# Altium footprint library ConnectorsTDH.PcbLib: 194 footprints (part 7 of 13)
Each footprint in its own frame and in the unit in brackets; x right, y up, seen from the top. Pads: shape width x height; smd on the part's side, far side on the other; paste and mask are expansions set on the pad; w line width, h text height; cw(c..) or ccw(c..) is an arc to the next point about the centre after c.
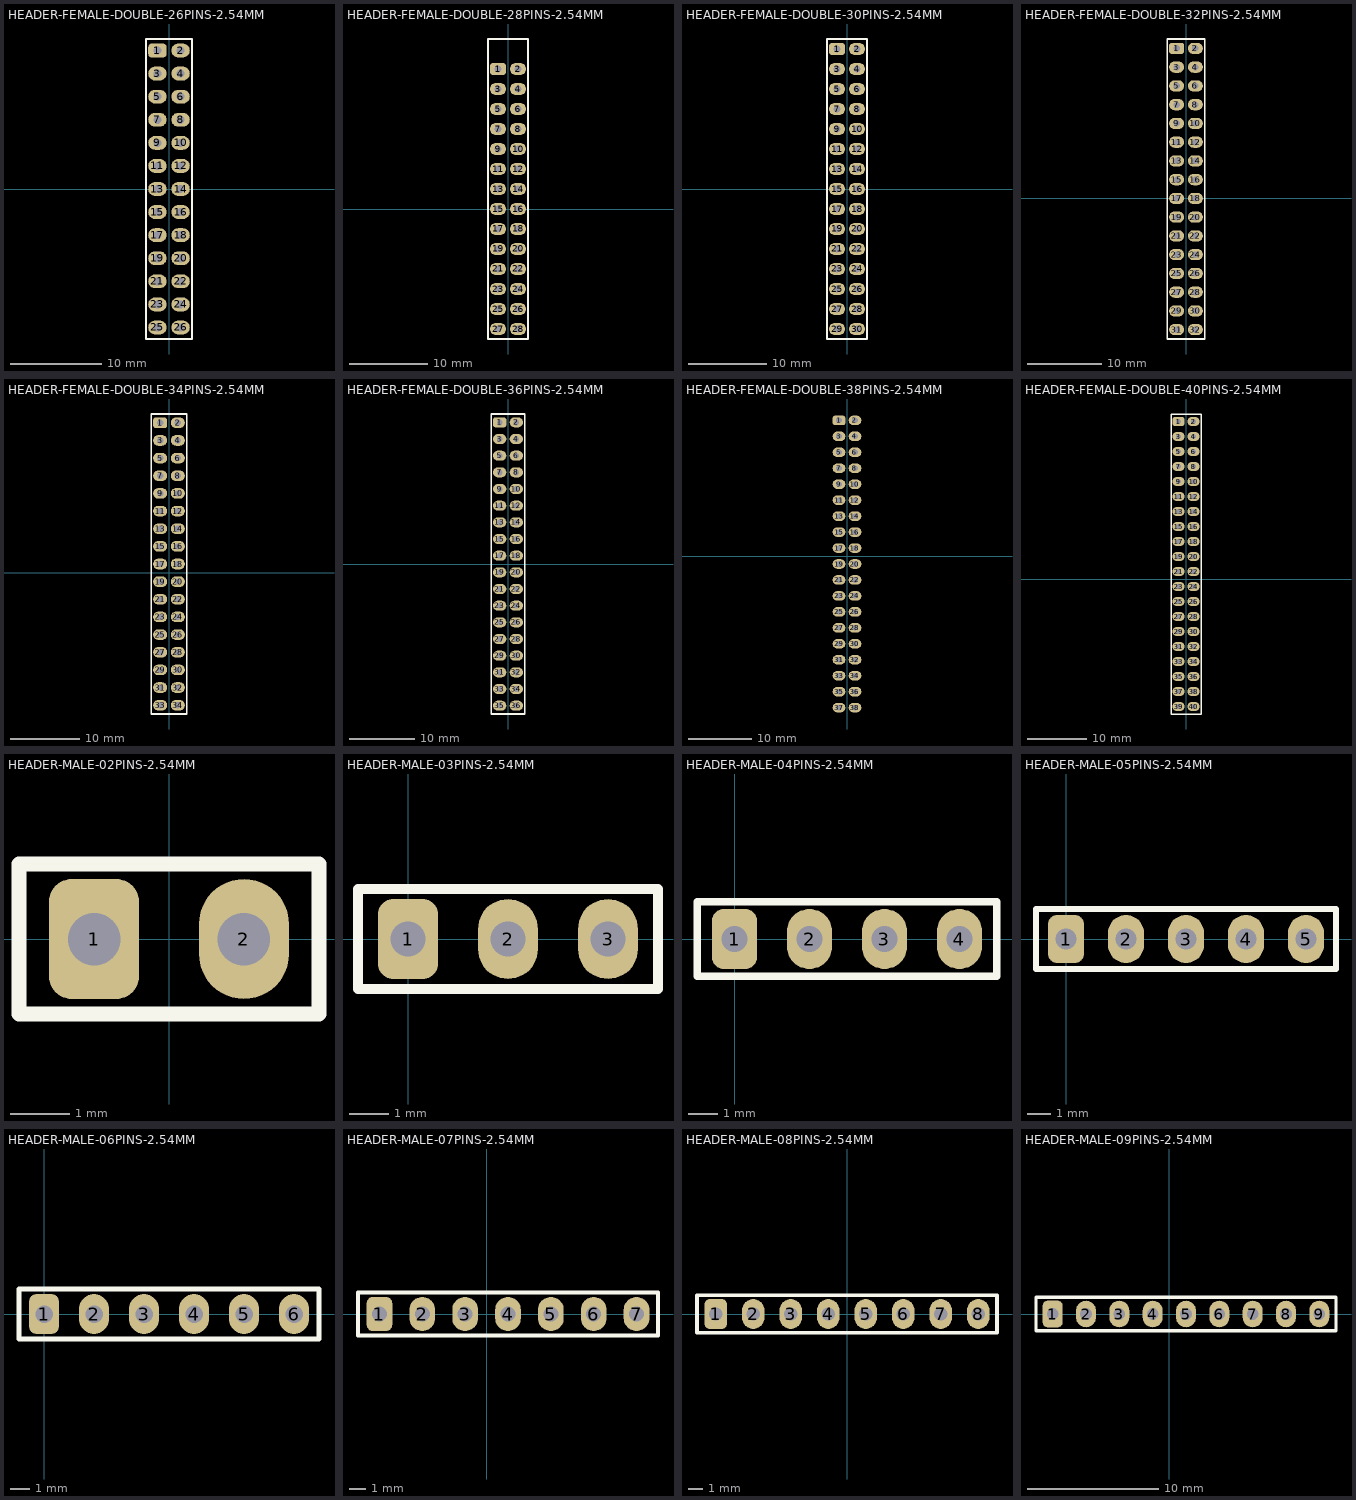
[diagram p6: the footprints below, top view; thin cyan lines are the x and y axes]

## HEADER-FEMALE-DOUBLE-26PINS-2.54MM [mil]
pads (26):
  rrect50% 80x60 hole 35: 1(-50,600)
  oval 80x60 hole 35: 2(50,600) 3(-50,500) 4(50,500) 5(-50,400) 6(50,400) 7(-50,300) 8(50,300) 9(-50,200) 10(50,200) 11(-50,100) 12(50,100) 13(-50,0) 14(50,0) 15(-50,-100) 16(50,-100) 17(-50,-200) 18(50,-200) 19(-50,-300) 20(50,-300) 21(-50,-400) 22(50,-400) 23(-50,-500) 24(50,-500) 25(-50,-600) 26(50,-600)
Top Overlay:
  lines w10: -100,-650 -100,650 100,650 100,-650 -100,-650
3D body "26-Pin Header - Female - Double - 2.54mm.step": height 334.65, standoff -118.11, extent -97.64,-659.84 99.21,659.85

## HEADER-FEMALE-DOUBLE-28PINS-2.54MM [mil]
pads (28):
  rrect50% 80x60 hole 35: 1(-50,700)
  oval 80x60 hole 35: 2(50,700) 3(-50,600) 4(50,600) 5(-50,500) 6(50,500) 7(-50,400) 8(50,400) 9(-50,300) 10(50,300) 11(-50,200) 12(50,200) 13(-50,100) 14(50,100) 15(-50,0) 16(50,0) 17(-50,-100) 18(50,-100) 19(-50,-200) 20(50,-200) 21(-50,-300) 22(50,-300) 23(-50,-400) 24(50,-400) 25(-50,-500) 26(50,-500) 27(-50,-600) 28(50,-600)
Top Overlay:
  lines w10: -100,-650 -100,850 100,850 100,-650 -100,-650
3D body "28-Pin Header - Female - Double - 2.54mm.step": height 334.65, standoff -118.11, extent -97.64,-659.84 99.21,859.85

## HEADER-FEMALE-DOUBLE-30PINS-2.54MM [mil]
pads (30):
  rrect50% 80x60 hole 35: 1(-50,700)
  oval 80x60 hole 35: 2(50,700) 3(-50,600) 4(50,600) 5(-50,500) 6(50,500) 7(-50,400) 8(50,400) 9(-50,300) 10(50,300) 11(-50,200) 12(50,200) 13(-50,100) 14(50,100) 15(-50,0) 16(50,0) 17(-50,-100) 18(50,-100) 19(-50,-200) 20(50,-200) 21(-50,-300) 22(50,-300) 23(-50,-400) 24(50,-400) 25(-50,-500) 26(50,-500) 27(-50,-600) 28(50,-600) 29(-50,-700) 30(50,-700)
Top Overlay:
  lines w10: -100,-750 -100,750 100,750 100,-750 -100,-750
3D body "28-Pin Header - Female - Double - 2.54mm.step": height 334.65, standoff -118.11, extent -97.64,-759.84 99.21,759.85

## HEADER-FEMALE-DOUBLE-32PINS-2.54MM [mil]
pads (32):
  rrect50% 80x60 hole 35: 1(-50,800)
  oval 80x60 hole 35: 2(50,800) 3(-50,700) 4(50,700) 5(-50,600) 6(50,600) 7(-50,500) 8(50,500) 9(-50,400) 10(50,400) 11(-50,300) 12(50,300) 13(-50,200) 14(50,200) 15(-50,100) 16(50,100) 17(-50,0) 18(50,0) 19(-50,-100) 20(50,-100) 21(-50,-200) 22(50,-200) 23(-50,-300) 24(50,-300) 25(-50,-400) 26(50,-400) 27(-50,-500) 28(50,-500) 29(-50,-600) 30(50,-600) 31(-50,-700) 32(50,-700)
Top Overlay:
  lines w10: -100,-750 -100,850 100,850 100,-750 -100,-750
3D body "32-Pin Header - Female - Double - 2.54mm.step": height 334.65, standoff -118.11, extent -97.64,-759.84 99.21,859.85

## HEADER-FEMALE-DOUBLE-34PINS-2.54MM [mil]
pads (34):
  rrect50% 80x60 hole 35: 1(-50,850)
  oval 80x60 hole 35: 2(50,850) 3(-50,750) 4(50,750) 5(-50,650) 6(50,650) 7(-50,550) 8(50,550) 9(-50,450) 10(50,450) 11(-50,350) 12(50,350) 13(-50,250) 14(50,250) 15(-50,150) 16(50,150) 17(-50,50) 18(50,50) 19(-50,-50) 20(50,-50) 21(-50,-150) 22(50,-150) 23(-50,-250) 24(50,-250) 25(-50,-350) 26(50,-350) 27(-50,-450) 28(50,-450) 29(-50,-550) 30(50,-550) 31(-50,-650) 32(50,-650) 33(-50,-750) 34(50,-750)
Top Overlay:
  lines w10: -100,-800 100,-800 100,900 -100,900 -100,-800
3D body "34-Pin Header - Female - Double - 2.54mm.step": height 334.65, standoff -118.11, extent -97.64,-809.84 99.21,909.85

## HEADER-FEMALE-DOUBLE-36PINS-2.54MM [mil]
pads (36):
  rrect50% 80x60 hole 35: 1(-50,850)
  oval 80x60 hole 35: 2(50,850) 3(-50,750) 4(50,750) 5(-50,650) 6(50,650) 7(-50,550) 8(50,550) 9(-50,450) 10(50,450) 11(-50,350) 12(50,350) 13(-50,250) 14(50,250) 15(-50,150) 16(50,150) 17(-50,50) 18(50,50) 19(-50,-50) 20(50,-50) 21(-50,-150) 22(50,-150) 23(-50,-250) 24(50,-250) 25(-50,-350) 26(50,-350) 27(-50,-450) 28(50,-450) 29(-50,-550) 30(50,-550) 31(-50,-650) 32(50,-650) 33(-50,-750) 34(50,-750) 35(-50,-850) 36(50,-850)
Top Overlay:
  lines w10: -100,-900 -100,900 100,900 100,-900 -100,-900
3D body "36-Pin Header - Female - Double - 2.54mm.step": height 334.65, standoff -118.11, extent -97.64,-909.84 99.21,909.85

## HEADER-FEMALE-DOUBLE-38PINS-2.54MM [mil]
pads (38):
  rrect50% 80x60 hole 35: 1(-50,850)
  oval 80x60 hole 35: 2(50,850) 3(-50,750) 4(50,750) 5(-50,650) 6(50,650) 7(-50,550) 8(50,550) 9(-50,450) 10(50,450) 11(-50,350) 12(50,350) 13(-50,250) 14(50,250) 15(-50,150) 16(50,150) 17(-50,50) 18(50,50) 19(-50,-50) 20(50,-50) 21(-50,-150) 22(50,-150) 23(-50,-250) 24(50,-250) 25(-50,-350) 26(50,-350) 27(-50,-450) 28(50,-450) 29(-50,-550) 30(50,-550) 31(-50,-650) 32(50,-650) 33(-50,-750) 34(50,-750) 35(-50,-850) 36(50,-850) 37(-50,-950) 38(50,-950)
3D body "38-Pin Header - Female - Double - 2.54mm.step": height 334.65, standoff -118.11, extent -97.64,-1009.84 99.21,909.85

## HEADER-FEMALE-DOUBLE-40PINS-2.54MM [mil]
pads (40):
  rrect50% 80x60 hole 35: 1(-50,1050)
  oval 80x60 hole 35: 2(50,1050) 3(-50,950) 4(50,950) 5(-50,850) 6(50,850) 7(-50,750) 8(50,750) 9(-50,650) 10(50,650) 11(-50,550) 12(50,550) 13(-50,450) 14(50,450) 15(-50,350) 16(50,350) 17(-50,250) 18(50,250) 19(-50,150) 20(50,150) 21(-50,50) 22(50,50) 23(-50,-50) 24(50,-50) 25(-50,-150) 26(50,-150) 27(-50,-250) 28(50,-250) 29(-50,-350) 30(50,-350) 31(-50,-450) 32(50,-450) 33(-50,-550) 34(50,-550) 35(-50,-650) 36(50,-650) 37(-50,-750) 38(50,-750) 39(-50,-850) 40(50,-850)
Top Overlay:
  lines w10: -100,-900 100,-900 100,1100 -100,1100 -100,-900
3D body "40-Pin Header - Female - Double - 2.54mm.step": height 334.65, standoff -118.11, extent -97.64,-909.84 99.21,1109.85

## HEADER-MALE-02PINS-2.54MM [mil]
pads (2):
  rrect50% 60x80 hole 35: 1(-50,0)
  oval 60x80 hole 35: 2(50,0)
Top Overlay:
  lines w10: -100,-50 100,-50 100,50 -100,50 -100,-50
3D body "2-Pin Header - Male - 2.54mm.step": height 350, standoff -120, extent -100,-50 100,50

## HEADER-MALE-03PINS-2.54MM [mil]
pads (3):
  rrect50% 60x80 hole 35: 1(0,0)
  oval 60x80 hole 35: 2(100,0) 3(200,0)
Top Overlay:
  lines w10: -50,-50 -50,50 250,50 250,-50 -50,-50
3D body "3-Pin Header - Male - 2.54mm.step": height 350, standoff -120, extent -49.99,-49.99 250.01,50.01

## HEADER-MALE-04PINS-2.54MM [mil]
pads (4):
  rrect50% 60x80 hole 35: 1(0,0)
  oval 60x80 hole 35: 2(100,0) 3(200,0) 4(300,0)
Top Overlay:
  lines w10: -50,-50 -50,50 350,50 350,-50 -50,-50
3D body "4-Pin Header - Male - 2.54mm.step": height 350, standoff -120, extent -49.99,-49.99 350.01,50.01

## HEADER-MALE-05PINS-2.54MM [mil]
pads (5):
  rrect50% 60x80 hole 35: 1(0,0)
  oval 60x80 hole 35: 2(100,0) 3(200,0) 4(300,0) 5(400,0)
Top Overlay:
  lines w10: -50,-50 -50,50 450,50 450,-50 -50,-50
3D body "5-Pin Header - Male - 2.54mm.step": height 350, standoff -120, extent -49.99,-49.99 450.01,50.01

## HEADER-MALE-06PINS-2.54MM [mil]
pads (6):
  rrect50% 60x80 hole 35: 1(0,0)
  oval 60x80 hole 35: 2(100,0) 3(200,0) 4(300,0) 5(400,0) 6(500,0)
Top Overlay:
  lines w10: -50,-50 -50,50 550,50 550,-50 -50,-50
3D body "6-Pin Header - Male - 2.54mm.step": height 350, standoff -120, extent -49.99,-49.99 550.01,50.01

## HEADER-MALE-07PINS-2.54MM [mil]
pads (7):
  rrect50% 60x80 hole 35: 1(-250,0)
  oval 60x80 hole 35: 2(-150,0) 3(-50,0) 4(50,0) 5(150,0) 6(250,0) 7(350,0)
Top Overlay:
  lines w10: -300,-50 -300,50 400,50 400,-50 -300,-50
3D body "7-Pin Header - Male - 2.54mm.step": height 350, standoff -120, extent -299.99,-49.99 400.01,50.01

## HEADER-MALE-08PINS-2.54MM [mil]
pads (8):
  rrect50% 60x80 hole 35: 1(-350,0)
  oval 60x80 hole 35: 2(-250,0) 3(-150,0) 4(-50,0) 5(50,0) 6(150,0) 7(250,0) 8(350,0)
Top Overlay:
  lines w10: -400,-50 -400,50 400,50 400,-50 -400,-50
3D body "8-Pin Header - Male - 2.54mm.step": height 350, standoff -120, extent -399.99,-49.99 400.01,50.01

## HEADER-MALE-09PINS-2.54MM [mil]
pads (9):
  rrect50% 60x80 hole 35: 1(-350,0)
  oval 60x80 hole 35: 2(-250,0) 3(-150,0) 4(-50,0) 5(50,0) 6(150,0) 7(250,0) 8(350,0) 9(450,0)
Top Overlay:
  lines w10: -400,-50 -400,50 500,50 500,-50 -400,-50
3D body "9-Pin Header - Male - 2.54mm.step": height 350, standoff -120, extent -399.99,-49.99 500.01,50.01